# Altium footprint library ICs And Semiconductors THD.PcbLib: 292 footprints (part 2 of 19)
Each footprint in its own frame and in the unit in brackets; x right, y up, seen from the top. Pads: shape width x height; smd on the part's side, far side on the other; paste and mask are expansions set on the pad; w line width, h text height; cw(c..) or ccw(c..) is an arc to the next point about the centre after c.
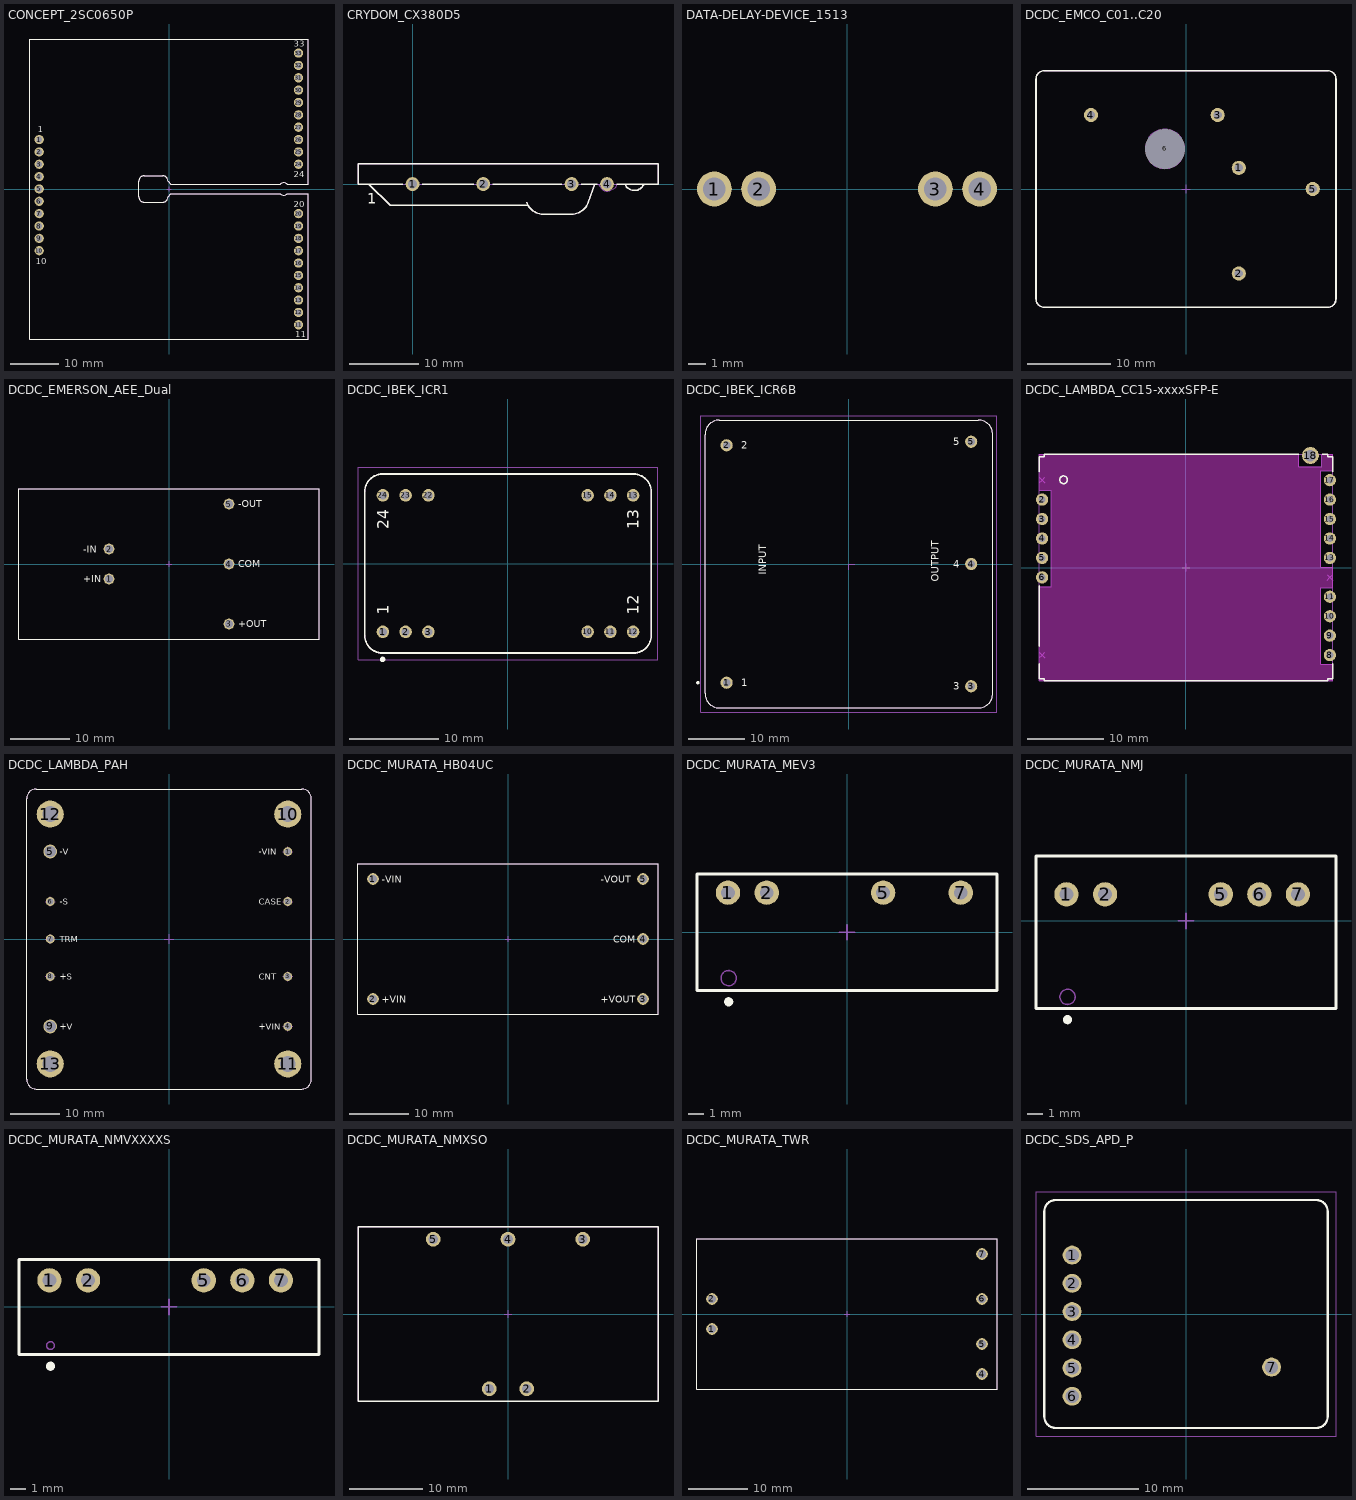
[diagram p1: the footprints below, top view; thin cyan lines are the x and y axes]

## CONCEPT_2SC0650P [mm] "Dual-Channel High-Power High-Frequency SCALE-2 Driver Core"
height 6.5
pads (30):
  round 1.9 hole 1.2: 1(-26.7,10.17) 2(-26.7,7.63) 3(-26.7,5.09) 4(-26.7,2.55) 5(-26.7,0.01) 6(-26.7,-2.53) 7(-26.7,-5.07) 8(-26.7,-7.61) 9(-26.7,-10.15) 10(-26.7,-12.69) 11(26.64,-27.93) 12(26.64,-25.39) 13(26.64,-22.85) 14(26.64,-20.31) 15(26.64,-17.77) 16(26.64,-15.23) 17(26.64,-12.69) 18(26.64,-10.15) 19(26.64,-7.61) 20(26.64,-5.07) 24(26.64,5.09) 25(26.64,7.63) 26(26.64,10.17) 27(26.64,12.71) 28(26.64,15.25) 29(26.64,17.79) 30(26.64,20.33) 31(26.64,22.87) 32(26.64,25.41) 33(26.64,27.95)
Top Overlay:
  lines w0.2: -28.6,-30.85 28.6,-30.85 28.6,-1 24.35,-1 cw(c23.6,0) 22.85,-1 0.4,-1 -0.2,-1.6 cw(c-1.3,-1.6) -1.3,-2.7 -5.1,-2.7 cw(c-5.1,-1.6) -6.2,-1.6 -6.2,1.6 cw(c-5.1,1.6) -5.1,2.7 -1.3,2.7 cw(c-1.3,1.6) -0.2,1.6 0.4,1 22.85,1 cw(c23.6,0) 24.35,1 28.6,1 28.6,30.85 -28.6,30.85 -28.6,-30.85
  text "1" at -26.973,11.627 h1.27
  text "10" at -27.453,-15.483 h1.27
  text "33" at 25.696,29.253 h1.27
  text "20" at 25.696,-3.767 h1.27
  text "24" at 25.684,2.387 h1.27
  text "11" at 25.94,-30.497 h1.27
Notvisible:
  lines w0.1: -27.2,-12.69 -26.7,-12.69 ; -27.2,-10.15 -26.7,-10.15 ; -27.2,-7.61 -26.7,-7.61 ; -27.2,-5.07 -26.7,-5.07 ; -27.2,-2.53 -26.7,-2.53 ; -27.2,0.01 -26.7,0.01 ; -27.2,2.55 -26.7,2.55 ; -27.2,5.09 -26.7,5.09 ; -27.2,7.63 -26.7,7.63 ; -27.2,10.17 -26.7,10.17 ; -26.7,-13.19 -26.7,-12.69 ; -26.7,-12.19 -26.7,-12.69 ; -26.7,-10.65 -26.7,-10.15 ; -26.7,-9.65 -26.7,-10.15 ; -26.7,-8.11 -26.7,-7.61 ; -26.7,-7.11 -26.7,-7.61 ; -26.7,-5.57 -26.7,-5.07 ; -26.7,-4.57 -26.7,-5.07 ; -26.7,-3.03 -26.7,-2.53 ; -26.7,-2.03 -26.7,-2.53 ; -26.7,-0.49 -26.7,0.01 ; -26.7,0.51 -26.7,0.01 ; -26.7,2.05 -26.7,2.55 ; -26.7,3.05 -26.7,2.55 ; -26.7,4.59 -26.7,5.09 ; -26.7,5.59 -26.7,5.09 ; -26.7,7.13 -26.7,7.63 ; -26.7,8.13 -26.7,7.63 ; -26.7,9.67 -26.7,10.17 ; -26.7,10.67 -26.7,10.17 ; -26.2,-12.69 -26.7,-12.69 ; -26.2,-10.15 -26.7,-10.15 ; -26.2,-7.61 -26.7,-7.61 ; -26.2,-5.07 -26.7,-5.07 ; -26.2,-2.53 -26.7,-2.53 ; -26.2,0.01 -26.7,0.01 ; -26.2,2.55 -26.7,2.55 ; -26.2,5.09 -26.7,5.09 ; -26.2,7.63 -26.7,7.63 ; -26.2,10.17 -26.7,10.17 ; -0.5,0 0,0 ; 0,-0.5 0,0 ; 0,0.5 0,0 ; 0.5,0 0,0 ; 26.14,-27.93 26.64,-27.93 ; 26.14,-25.39 26.64,-25.39 ; 26.14,-22.85 26.64,-22.85 ; 26.14,-20.31 26.64,-20.31 ; 26.14,-17.77 26.64,-17.77 ; 26.14,-15.23 26.64,-15.23 ; 26.14,-12.69 26.64,-12.69 ; 26.14,-10.15 26.64,-10.15 ; 26.14,-7.61 26.64,-7.61 ; 26.14,-5.07 26.64,-5.07 ; 26.14,5.09 26.64,5.09 ; 26.14,7.63 26.64,7.63 ; 26.14,10.17 26.64,10.17 ; 26.14,12.71 26.64,12.71 ; 26.14,15.25 26.64,15.25 ; 26.14,17.79 26.64,17.79 ; 26.14,20.33 26.64,20.33 ; 26.14,22.87 26.64,22.87 ; 26.14,25.41 26.64,25.41 ; 26.14,27.95 26.64,27.95 ; 26.64,-28.43 26.64,-27.93 ; 26.64,-27.43 26.64,-27.93 ; 26.64,-25.89 26.64,-25.39 ; 26.64,-24.89 26.64,-25.39 ; 26.64,-23.35 26.64,-22.85 ; 26.64,-22.35 26.64,-22.85 ; 26.64,-20.81 26.64,-20.31 ; 26.64,-19.81 26.64,-20.31 ; 26.64,-18.27 26.64,-17.77 ; 26.64,-17.27 26.64,-17.77 ; 26.64,-15.73 26.64,-15.23 ; 26.64,-14.73 26.64,-15.23 ; 26.64,-13.19 26.64,-12.69 ; 26.64,-12.19 26.64,-12.69 ; 26.64,-10.65 26.64,-10.15 ; 26.64,-9.65 26.64,-10.15 ; 26.64,-8.11 26.64,-7.61 ; 26.64,-7.11 26.64,-7.61 ; 26.64,-5.57 26.64,-5.07 ; 26.64,-4.57 26.64,-5.07 ; 26.64,4.59 26.64,5.09 ; 26.64,5.59 26.64,5.09 ; 26.64,7.13 26.64,7.63 ; 26.64,8.13 26.64,7.63 ; 26.64,9.67 26.64,10.17 ; 26.64,10.67 26.64,10.17 ; 26.64,12.21 26.64,12.71 ; 26.64,13.21 26.64,12.71 ; 26.64,14.75 26.64,15.25 ; 26.64,15.75 26.64,15.25 ; 26.64,17.29 26.64,17.79 ; 26.64,18.29 26.64,17.79 ; 26.64,19.83 26.64,20.33 ; 26.64,20.83 26.64,20.33 ; 26.64,22.37 26.64,22.87 ; 26.64,23.37 26.64,22.87 ; 26.64,24.91 26.64,25.41 ; 26.64,25.91 26.64,25.41 ; 26.64,27.45 26.64,27.95 ; 26.64,28.45 26.64,27.95 ; 27.14,-27.93 26.64,-27.93 ; 27.14,-25.39 26.64,-25.39 ; 27.14,-22.85 26.64,-22.85 ; 27.14,-20.31 26.64,-20.31 ; 27.14,-17.77 26.64,-17.77 ; 27.14,-15.23 26.64,-15.23 ; 27.14,-12.69 26.64,-12.69 ; 27.14,-10.15 26.64,-10.15 ; 27.14,-7.61 26.64,-7.61 ; 27.14,-5.07 26.64,-5.07 ; 27.14,5.09 26.64,5.09 ; 27.14,7.63 26.64,7.63 ; 27.14,10.17 26.64,10.17 ; 27.14,12.71 26.64,12.71 ; 27.14,15.25 26.64,15.25 ; 27.14,17.79 26.64,17.79 ; 27.14,20.33 26.64,20.33 ; 27.14,22.87 26.64,22.87 ; 27.14,25.41 26.64,25.41 ; 27.14,27.95 26.64,27.95
Mechanical 14:
  lines w0.1: -28.6,-30.85 28.6,-30.85 28.6,-1 24.35,-1 cw(c23.6,0) 22.85,-1 0.4,-1 -0.2,-1.6 cw(c-1.3,-1.6) -1.3,-2.7 -5.1,-2.7 cw(c-5.1,-1.6) -6.2,-1.6 -6.2,1.6 cw(c-5.1,1.6) -5.1,2.7 -1.3,2.7 cw(c-1.3,1.6) -0.2,1.6 0.4,1 22.85,1 cw(c23.6,0) 24.35,1 28.6,1 28.6,30.85 -28.6,30.85 -28.6,-30.85
  text "1" at -26.973,11.627 h1.27
  text "10" at -27.453,-15.483 h1.27
  text "33" at 25.696,29.253 h1.27
  text "20" at 25.696,-3.767 h1.27
  text "24" at 25.684,2.387 h1.27
  text "11" at 25.94,-30.497 h1.27
3D body "CONCEPT_2SC0650P.stp": height 6.68, standoff -2.54, extent -28.6,-30.85 28.6,30.85

## CRYDOM_CX380D5 [mm] "CRYDOM CX Serie, 4 Leads, Body 43.1 x 7.6mm, SIP Solid State Relay"
height 26.7
pads (4):
  round 2 hole 1.3: 1(0,0) 2(10.16,0) 3(22.86,0) 4(27.94,0)
Top Overlay:
  lines w0.2: -6.263,0 -3.215,-3.048 16.581,-3.048 ; -1.4,0 -7.834,0 -7.834,2.911 35.266,2.911 35.266,0 29.34,0 ; 1.4,0 8.76,0 ; 11.56,0 21.46,0 ; 16.379,-2.605 ccw(c18.781,-1.778) 18.781,-4.318 22.852,-4.318 ccw(c22.852,-1.778) 25.253,-2.605 26.15,0 ; 24.26,0 26.54,0 ; 30.534,0 ccw(c31.89,0.544) 33.11,-0.258 33.28,0
  text "1" at -6.5,-2.8 h1.5
Notvisible:
  lines w0.1: -0.5,0 0,0 ; 0,-0.5 0,0 ; 0,0.5 0,0 ; 0.5,0 0,0 ; 9.66,0 10.16,0 ; 10.16,-0.5 10.16,0 ; 10.16,0.5 10.16,0 ; 10.66,0 10.16,0 ; 22.36,0 22.86,0 ; 22.86,-0.5 22.86,0 ; 22.86,0.5 22.86,0 ; 23.36,0 22.86,0 ; 27.44,0 27.94,0 ; 27.94,-0.5 27.94,0 ; 27.94,0.5 27.94,0 ; 28.44,0 27.94,0
Mechanical 14:
  lines w0.1: -6.263,0 -3.215,-3.048 16.581,-3.048 ; 16.379,-2.605 ccw(c18.781,-1.778) 18.781,-4.318 22.852,-4.318 ccw(c22.852,-1.778) 25.253,-2.605 26.15,0 ; 26.695,0 26.936,-0.365 ccw(c28.08,0.544) 29.435,0 ; 27.053,-0.495 ccw(c27.94,0) 28.48,-0.861 ; 30.534,0 ccw(c31.89,0.544) 33.11,-0.258 33.28,0 ; -7.834,0 -7.834,2.911 35.266,2.911 35.266,0 -7.834,0
  text "1" at -6.5,-2.8 h1.5
3D body "CRYDOM_CX380D5.stp": height 26.7, standoff -5.08, extent -7.834,-4.318 35.266,2.911

## DATA-DELAY-DEVICE_1513 [mm] "DATA-DELAY-DEVICE 1513 Serie, 4 Leads, Body 20.57 x 5.33mm, SIP Delay Line"
height 7.11
pads (4):
  round 2 hole 1.3: 1(-7.62,0) 2(-5.08,0) 3(5.08,0) 4(7.62,0)

## DCDC_EMCO_C01..C20 [mm] "C Series , Body 35.56 x 27.94mm, High Voltage DC-DC Converter"
height 13.21
pads (6):
  round 1.7 hole 1: 1(6.35,2.54) 2(6.35,-10.16) 3(3.81,8.89) 4(-11.43,8.89) 5(15.24,0)
  round 1 hole 4.8 unplated mask+1.9: 6(-2.54,4.83)
Top Overlay:
  lines w0.2: -18.035,-13.225 ccw(c-17.035,-13.225) -17.035,-14.225 17.035,-14.225 ccw(c17.035,-13.225) 18.035,-13.225 18.035,13.225 ccw(c17.035,13.225) 17.035,14.225 -17.035,14.225 ccw(c-17.035,13.225) -18.035,13.225 -18.035,-13.225
Notvisible:
  circle w0.1: c-2.54,4.83 r2.375
  lines w0.1: -11.93,8.89 -11.43,8.89 ; -11.43,8.39 -11.43,8.89 ; -11.43,9.39 -11.43,8.89 ; -10.93,8.89 -11.43,8.89 ; -3.04,4.83 -2.54,4.83 ; -2.54,4.33 -2.54,4.83 ; -2.54,5.33 -2.54,4.83 ; -2.04,4.83 -2.54,4.83 ; -0.5,0 0,0 ; 0,-0.5 0,0 ; 0,0.5 0,0 ; 0.5,0 0,0 ; 3.31,8.89 3.81,8.89 ; 3.81,8.39 3.81,8.89 ; 3.81,9.39 3.81,8.89 ; 4.31,8.89 3.81,8.89 ; 5.85,-10.16 6.35,-10.16 ; 5.85,2.54 6.35,2.54 ; 6.35,-10.66 6.35,-10.16 ; 6.35,-9.66 6.35,-10.16 ; 6.35,2.04 6.35,2.54 ; 6.35,3.04 6.35,2.54 ; 6.85,-10.16 6.35,-10.16 ; 6.85,2.54 6.35,2.54 ; 14.74,0 15.24,0 ; 15.24,-0.5 15.24,0 ; 15.24,0.5 15.24,0 ; 15.74,0 15.24,0
Mechanical 14:
  lines w0.1: -18.035,-13.225 ccw(c-17.035,-13.225) -17.035,-14.225 17.035,-14.225 ccw(c17.035,-13.225) 18.035,-13.225 18.035,13.225 ccw(c17.035,13.225) 17.035,14.225 -17.035,14.225 ccw(c-17.035,13.225) -18.035,13.225 -18.035,-13.225
3D body "DCDC_EMCO_C.stp": height 13.21, standoff -3.8, extent -18.035,-14.225 18.035,14.225

## DCDC_EMERSON_AEE_Dual [mm] "AEE 15W Series , Dual Output DCDC Converter, Body 50.8x25.4mm, Height 11.3mm"
height 11.3
pads (5):
  round 1.8 hole 1.3: 1(-10.16,-2.54) 2(-10.16,2.54) 3(10.16,-10.16) 4(10.16,0) 5(10.16,10.16)
Top Overlay:
  lines w0.2: -25.4,-12.7 -25.4,12.7 25.4,12.7 25.4,-12.7 -25.4,-12.7
  text "-IN" at -14.55,1.9 h1.2
  text "-OUT" at 11.71,9.645 h1.2
  text "+OUT" at 11.71,-10.675 h1.2
  text "+IN" at -14.55,-3.1 h1.2
  text "COM" at 11.71,-0.515 h1.2
Notvisible:
  lines w0.1: -10.66,-2.54 -10.16,-2.54 ; -10.66,2.54 -10.16,2.54 ; -10.16,-3.04 -10.16,-2.54 ; -10.16,-2.04 -10.16,-2.54 ; -10.16,2.04 -10.16,2.54 ; -10.16,3.04 -10.16,2.54 ; -9.66,-2.54 -10.16,-2.54 ; -9.66,2.54 -10.16,2.54 ; -0.5,0 0,0 ; 0,-0.5 0,0 ; 0,0.5 0,0 ; 0.5,0 0,0 ; 9.66,-10.16 10.16,-10.16 ; 9.66,0 10.16,0 ; 9.66,10.16 10.16,10.16 ; 10.16,-10.66 10.16,-10.16 ; 10.16,-9.66 10.16,-10.16 ; 10.16,-0.5 10.16,0 ; 10.16,0.5 10.16,0 ; 10.16,9.66 10.16,10.16 ; 10.16,10.66 10.16,10.16 ; 10.66,-10.16 10.16,-10.16 ; 10.66,0 10.16,0 ; 10.66,10.16 10.16,10.16
Mechanical 14:
  lines w0.1: -25.4,-12.7 -25.4,12.7 25.4,12.7 25.4,-12.7 -25.4,-12.7
  text "+OUT" at 11.71,-10.675 h1.2
  text "-OUT" at 11.71,9.645 h1.2
  text "+IN" at -14.55,-3.1 h1.2
  text "-IN" at -14.55,1.9 h1.2
  text "COM" at 11.71,-0.515 h1.2
3D body "DCDC_EMERSON_AEE_Dual.stp": height 11.3, standoff -3.8, extent -25.4,-12.7 25.4,12.7

## DCDC_IBEK_ICR1 [mm] "ICR1 Series , Body 32x20mm, Pitch 2.54mm"
height 10.5
pads (12):
  round 1.4 hole 0.9: 1(-13.97,-7.62) 2(-11.43,-7.62) 3(-8.89,-7.62) 10(8.89,-7.62) 11(11.43,-7.62) 12(13.97,-7.62) 13(13.97,7.62) 14(11.43,7.62) 15(8.89,7.62) 22(-8.89,7.62) 23(-11.43,7.62) 24(-13.97,7.62)
Top Overlay:
  circle w0.3: c-14,-10.7 r0.15
  lines w0.2: -16,-8 ccw(c-14,-8) -14,-10 14,-10 ccw(c14,-8) 16,-8 16,8 ccw(c14,8) 14,10 -14,10 ccw(c-14,8) -16,8 -16,-8
  text "12" at 14.605,-5.715 h1.27
  text "24" at -13.335,3.81 h1.27
  text "13" at 14.605,3.81 h1.27
  text "1" at -13.335,-5.715 h1.27
Mechanical 14:
  lines w0.1: -16,-8 ccw(c-14,-8) -14,-10 14,-10 ccw(c14,-8) 16,-8 16,8 ccw(c14,8) 14,10 -14,10 ccw(c-14,8) -16,8 -16,-8
  text "24" at -13.335,3.81 h1.27
  text "13" at 14.605,3.81 h1.27
  text "12" at 14.605,-5.715 h1.27
  text "1" at -13.335,-5.715 h1.27
Mechanical 15:
  lines w0.05: -16.75,-10.75 -16.75,10.75 16.75,10.75 16.75,-10.75 -16.75,-10.75
3D body "DCDC_IBEK_ICR1.stp": height 10.5, standoff -3, extent -16,-10 16,10

## DCDC_IBEK_ICR6B [mm] "ICR6 Series , Body 50.8x50.8mm"
height 10.5
pads (5):
  round 2.15 hole 1.3: 1(-21.59,-20.955) 2(-21.59,20.955) 3(21.59,-21.59) 4(21.59,0) 5(21.59,21.59)
Top Overlay:
  circle w0.3: c-26.67,-20.955 r0.15
  lines w0.2: -25.4,-22.86 ccw(c-22.86,-22.86) -22.86,-25.4 22.86,-25.4 ccw(c22.86,-22.86) 25.4,-22.86 25.4,22.86 ccw(c22.86,22.86) 22.86,25.4 -22.86,25.4 ccw(c-22.86,22.86) -25.4,22.86 -25.4,-22.86
  text "3" at 18.415,-22.225 h1.27
  text "4" at 18.415,-0.635 h1.27
  text "5" at 18.415,20.955 h1.27
  text "2" at -19.05,20.32 h1.27
  text "1" at -19.05,-21.59 h1.27
  text "INPUT" at -14.605,-1.905 h1.27
  text "OUTPUT" at 15.875,-3.175 h1.27
Notvisible:
  circle w0.1: c-21.59,-20.955 r0.5
  circle w0.1: c21.59,-21.59 r0.5
  circle w0.1: c21.59,0 r0.5
  circle w0.1: c21.59,21.59 r0.5
  circle w0.1: c-21.59,20.955 r0.5
  lines w0.2: -21.59,-21.955 -21.59,-20.955 -20.59,-20.955 ; -21.59,19.955 -21.59,20.955 -20.59,20.955 ; 0,-1 0,0 1,0 ; 21.59,-22.59 21.59,-21.59 22.59,-21.59 ; 21.59,-1 21.59,0 22.59,0 ; 21.59,20.59 21.59,21.59 22.59,21.59
Mechanical 14:
  lines w0.1: -25.4,-22.86 ccw(c-22.86,-22.86) -22.86,-25.4 22.86,-25.4 ccw(c22.86,-22.86) 25.4,-22.86 25.4,22.86 ccw(c22.86,22.86) 22.86,25.4 -22.86,25.4 ccw(c-22.86,22.86) -25.4,22.86 -25.4,-22.86
  text "3" at 18.415,-22.225 h1.27
  text "4" at 18.415,-0.635 h1.27
  text "5" at 18.415,20.955 h1.27
  text "2" at -19.05,20.32 h1.27
  text "1" at -19.05,-21.59 h1.27
  text "INPUT" at -14.605,-1.905 h1.27
  text "OUTPUT" at 15.875,-3.175 h1.27
Mechanical 15:
  lines w0.05: -26.15,-26.15 -26.15,26.15 26.15,26.15 26.15,-26.15 -26.15,-26.15
3D body "DCDC_IBEK_ICR6B.stp": height 10.5, standoff -3, extent -25.4,-25.4 25.4,25.4

## DCDC_LAMBDA_CC15-xxxxSFP-E [mm] "CCP-E Series, Body L 38.4mm x W 29.6mm x H 6.8mm"
height 6.8
pads (15):
  round 1.6 hole 0.9: 2(-18.8,8.89) 3(-18.8,6.35) 4(-18.8,3.81) 5(-18.8,1.27) 6(-18.8,-1.27) 8(18.8,-11.43) 9(18.8,-8.89) 10(18.8,-6.35) 11(18.8,-3.81) 13(18.8,1.27) 14(18.8,3.81) 15(18.8,6.35) 16(18.8,8.89) 17(18.8,11.43)
  round 2.2 hole 1.5: 18(16.26,14.65)
Top Layer keep-out:
  region: -19.2,-2.47 -17.6,-2.47 -17.6,10.09 -19.2,10.09 -19.2,14.8 14.76,14.8 14.76,13.15 17.76,13.15 17.76,14.8 19.2,14.8 19.2,12.63 17.6,12.63 17.6,0.07 19.2,0.07 19.2,-2.61 17.6,-2.61 17.6,-12.63 19.2,-12.63 19.2,-14.8 -19.2,-14.8
Top Overlay:
  circle w0.2: c-16,11.48 r0.5
  lines w0.2: -19.2,-12.561 -19.2,-14.5 -18.5,-14.5 -18.5,-14.8 18.5,-14.8 18.5,-14.5 19.2,-14.5 19.2,-12.561 ; -19.2,-10.299 -19.2,-2.401 ; -19.2,12.561 -19.2,14.5 -18.5,14.5 -18.5,14.8 14.732,14.8 ; 17.78,14.8 18.5,14.8 18.5,14.5 19.2,14.5 19.2,12.561
Notvisible:
  lines w0.1: -19.3,-1.27 -18.8,-1.27 ; -19.3,1.27 -18.8,1.27 ; -19.3,3.81 -18.8,3.81 ; -19.3,6.35 -18.8,6.35 ; -19.3,8.89 -18.8,8.89 ; -19.154,-11.784 -18.8,-11.43 ; -19.154,-11.076 -18.8,-11.43 ; -19.154,11.076 -18.8,11.43 ; -19.154,11.784 -18.8,11.43 ; -18.8,-1.77 -18.8,-1.27 ; -18.8,-0.77 -18.8,-1.27 ; -18.8,0.77 -18.8,1.27 ; -18.8,1.77 -18.8,1.27 ; -18.8,3.31 -18.8,3.81 ; -18.8,4.31 -18.8,3.81 ; -18.8,5.85 -18.8,6.35 ; -18.8,6.85 -18.8,6.35 ; -18.8,8.39 -18.8,8.89 ; -18.8,9.39 -18.8,8.89 ; -18.446,-11.784 -18.8,-11.43 ; -18.446,-11.076 -18.8,-11.43 ; -18.446,11.076 -18.8,11.43 ; -18.446,11.784 -18.8,11.43 ; -18.3,-1.27 -18.8,-1.27 ; -18.3,1.27 -18.8,1.27 ; -18.3,3.81 -18.8,3.81 ; -18.3,6.35 -18.8,6.35 ; -18.3,8.89 -18.8,8.89 ; -0.5,0 0,0 ; 0,-0.5 0,0 ; 0,0.5 0,0 ; 0.5,0 0,0 ; 15.76,14.65 16.26,14.65 ; 16.26,14.15 16.26,14.65 ; 16.26,15.15 16.26,14.65 ; 16.76,14.65 16.26,14.65 ; 18.3,-11.43 18.8,-11.43 ; 18.3,-8.89 18.8,-8.89 ; 18.3,-6.35 18.8,-6.35 ; 18.3,-3.81 18.8,-3.81 ; 18.3,1.27 18.8,1.27 ; 18.3,3.81 18.8,3.81 ; 18.3,6.35 18.8,6.35 ; 18.3,8.89 18.8,8.89 ; 18.3,11.43 18.8,11.43 ; 18.446,-1.624 18.8,-1.27 ; 18.446,-0.916 18.8,-1.27 ; 18.8,-11.93 18.8,-11.43 ; 18.8,-10.93 18.8,-11.43 ; 18.8,-9.39 18.8,-8.89 ; 18.8,-8.39 18.8,-8.89 ; 18.8,-6.85 18.8,-6.35 ; 18.8,-5.85 18.8,-6.35 ; 18.8,-4.31 18.8,-3.81 ; 18.8,-3.31 18.8,-3.81 ; 18.8,0.77 18.8,1.27 ; 18.8,1.77 18.8,1.27 ; 18.8,3.31 18.8,3.81 ; 18.8,4.31 18.8,3.81 ; 18.8,5.85 18.8,6.35 ; 18.8,6.85 18.8,6.35 ; 18.8,8.39 18.8,8.89 ; 18.8,9.39 18.8,8.89 ; 18.8,10.93 18.8,11.43 ; 18.8,11.93 18.8,11.43 ; 19.154,-1.624 18.8,-1.27 ; 19.154,-0.916 18.8,-1.27 ; 19.3,-11.43 18.8,-11.43 ; 19.3,-8.89 18.8,-8.89 ; 19.3,-6.35 18.8,-6.35 ; 19.3,-3.81 18.8,-3.81 ; 19.3,1.27 18.8,1.27 ; 19.3,3.81 18.8,3.81 ; 19.3,6.35 18.8,6.35 ; 19.3,8.89 18.8,8.89 ; 19.3,11.43 18.8,11.43 ; -19.2,-14.8 19.2,-14.8 19.2,-12.63 17.6,-12.63 17.6,-2.61 19.2,-2.61 19.2,0.07 17.6,0.07 17.6,12.63 19.2,12.63 19.2,14.8 17.76,14.8 17.76,13.15 14.76,13.15 14.76,14.8 -19.2,14.8 -19.2,10.09 -17.6,10.09 -17.6,-2.47 -19.2,-2.47 -19.2,-14.8
Mechanical 14:
  circle w0.1: c-16,11.48 r0.5
  lines w0.1: -19.2,-14.5 -19.2,14.5 -18.5,14.5 -18.5,14.8 18.5,14.8 18.5,14.5 19.2,14.5 19.2,-14.5 18.5,-14.5 18.5,-14.8 -18.5,-14.8 -18.5,-14.5 -19.2,-14.5
3D body "DC-DC_LAMBDA_CC15-xxxxSFP-E.stp": height 6.3, standoff -2.5, extent -19.2,-14.8 19.2,14.8

## DCDC_LAMBDA_PAH [mm] "PAH Series , Body 57.9x61mm"
height 12.95
pads (13):
  round 1.8 hole 1.3: 1(24.15,17.78) 2(24.15,7.62) 3(24.15,-7.62) 4(24.15,-17.78) 6(-24.15,7.62) 7(-24.15,0) 8(-24.15,-7.62)
  round 2.8 hole 2.3: 5(-24.15,17.78) 9(-24.15,-17.78)
  round 5.5 hole 3.2: 10(24.15,25.4) 11(24.15,-25.4) 12(-24.15,25.4) 13(-24.15,-25.4)
Top Overlay:
  lines w0.2: -28.95,-28.5 ccw(c-26.95,-28.5) -26.95,-30.5 26.95,-30.5 ccw(c26.95,-28.5) 28.95,-28.5 28.95,28.5 ccw(c26.95,28.5) 26.95,30.5 -26.95,30.5 ccw(c-26.95,28.5) -28.95,28.5 -28.95,-28.5
  text "+VIN" at 18.265,-18.435 h1.27
  text "CNT" at 18.265,-8.275 h1.27
  text "CASE" at 18.265,6.965 h1.27
  text "-V" at -22.175,17.085 h1.27
  text "+V" at -22.175,-18.475 h1.27
  text "+S" at -22.175,-8.315 h1.27
  text "-S" at -22.175,6.925 h1.27
  text "-VIN" at 18.265,17.125 h1.27
  text "TRM" at -22.175,-0.695 h1.27
Notvisible:
  lines w0.1: -25.15,-25.4 -24.15,-25.4 ; -25.15,-17.78 -24.15,-17.78 ; -25.15,-7.62 -24.15,-7.62 ; -25.15,0 -24.15,0 ; -25.15,7.62 -24.15,7.62 ; -25.15,17.78 -24.15,17.78 ; -25.15,25.4 -24.15,25.4 ; -24.15,-26.4 -24.15,-25.4 ; -24.15,-24.4 -24.15,-25.4 ; -24.15,-18.78 -24.15,-17.78 ; -24.15,-16.78 -24.15,-17.78 ; -24.15,-8.62 -24.15,-7.62 ; -24.15,-6.62 -24.15,-7.62 ; -24.15,-1 -24.15,0 ; -24.15,1 -24.15,0 ; -24.15,6.62 -24.15,7.62 ; -24.15,8.62 -24.15,7.62 ; -24.15,16.78 -24.15,17.78 ; -24.15,18.78 -24.15,17.78 ; -24.15,24.4 -24.15,25.4 ; -24.15,26.4 -24.15,25.4 ; -23.15,-25.4 -24.15,-25.4 ; -23.15,-17.78 -24.15,-17.78 ; -23.15,-7.62 -24.15,-7.62 ; -23.15,0 -24.15,0 ; -23.15,7.62 -24.15,7.62 ; -23.15,17.78 -24.15,17.78 ; -23.15,25.4 -24.15,25.4 ; -1,0 0,0 ; 0,-1 0,0 ; 0,1 0,0 ; 1,0 0,0 ; 23.15,-25.4 24.15,-25.4 ; 23.15,-17.78 24.15,-17.78 ; 23.15,-7.62 24.15,-7.62 ; 23.15,7.62 24.15,7.62 ; 23.15,17.78 24.15,17.78 ; 23.15,25.4 24.15,25.4 ; 24.15,-26.4 24.15,-25.4 ; 24.15,-24.4 24.15,-25.4 ; 24.15,-18.78 24.15,-17.78 ; 24.15,-16.78 24.15,-17.78 ; 24.15,-8.62 24.15,-7.62 ; 24.15,-6.62 24.15,-7.62 ; 24.15,6.62 24.15,7.62 ; 24.15,8.62 24.15,7.62 ; 24.15,16.78 24.15,17.78 ; 24.15,18.78 24.15,17.78 ; 24.15,24.4 24.15,25.4 ; 24.15,26.4 24.15,25.4 ; 25.15,-25.4 24.15,-25.4 ; 25.15,-17.78 24.15,-17.78 ; 25.15,-7.62 24.15,-7.62 ; 25.15,7.62 24.15,7.62 ; 25.15,17.78 24.15,17.78 ; 25.15,25.4 24.15,25.4
Mechanical 14:
  lines w0.1: -28.95,-28.5 ccw(c-26.95,-28.5) -26.95,-30.5 26.95,-30.5 ccw(c26.95,-28.5) 28.95,-28.5 28.95,28.5 ccw(c26.95,28.5) 26.95,30.5 -26.95,30.5 ccw(c-26.95,28.5) -28.95,28.5 -28.95,-28.5
  text "+VIN" at 18.265,-18.435 h1.27
  text "CNT" at 18.265,-8.275 h1.27
  text "CASE" at 18.265,6.965 h1.27
  text "-V" at -22.175,17.085 h1.27
  text "+V" at -22.175,-18.475 h1.27
  text "+S" at -22.175,-8.315 h1.27
  text "-S" at -22.175,6.925 h1.27
  text "-VIN" at 18.265,17.125 h1.27
  text "TRM" at -22.175,-0.695 h1.27
3D body "DC-DC_LAMBDA_PAH.stp": height 12.95, standoff -3.8, extent -28.95,-30.5 28.95,30.5

## DCDC_MURATA_HB04UC [mm] "HB04UC Series , Body 50.8x25.4mm, Height 10.4mm"
height 10.41
pads (5):
  round 2 hole 1.3: 1(-22.86,10.16) 2(-22.86,-10.16) 3(22.86,-10.16) 4(22.86,0) 5(22.86,10.16)
Top Overlay:
  lines w0.2: -25.4,-12.7 25.4,-12.7 25.4,12.7 -25.4,12.7 -25.4,-12.7
  text "+VIN" at -21.385,-10.765 h1.2
  text "+VOUT" at 15.725,-10.815 h1.2
  text "-VIN" at -21.385,9.555 h1.2
  text "COM" at 17.825,-0.605 h1.2
  text "-VOUT" at 15.725,9.505 h1.2
Notvisible:
  lines w0.1: -23.36,-10.16 -22.86,-10.16 ; -23.36,10.16 -22.86,10.16 ; -22.86,-10.66 -22.86,-10.16 ; -22.86,-9.66 -22.86,-10.16 ; -22.86,9.66 -22.86,10.16 ; -22.86,10.66 -22.86,10.16 ; -22.36,-10.16 -22.86,-10.16 ; -22.36,10.16 -22.86,10.16 ; -0.5,0 0,0 ; 0,-0.5 0,0 ; 0,0.5 0,0 ; 0.5,0 0,0 ; 22.36,-10.16 22.86,-10.16 ; 22.36,0 22.86,0 ; 22.36,10.16 22.86,10.16 ; 22.86,-10.66 22.86,-10.16 ; 22.86,-9.66 22.86,-10.16 ; 22.86,-0.5 22.86,0 ; 22.86,0.5 22.86,0 ; 22.86,9.66 22.86,10.16 ; 22.86,10.66 22.86,10.16 ; 23.36,-10.16 22.86,-10.16 ; 23.36,0 22.86,0 ; 23.36,10.16 22.86,10.16
Mechanical 14:
  lines w0.1: -25.4,-12.7 25.4,-12.7 25.4,12.7 -25.4,12.7 -25.4,-12.7
  text "+VIN" at -21.385,-10.765 h1.2
  text "+VOUT" at 15.725,-10.815 h1.2
  text "-VIN" at -21.385,9.555 h1.2
  text "COM" at 17.825,-0.605 h1.2
  text "-VOUT" at 15.725,9.505 h1.2
3D body "DCDC_MURATA_HB04UC.stp": height 10.46, standoff -3.8, extent -25.4,-12.7 25.4,12.7

## DCDC_MURATA_MEV3 [mm] "MEV3S Series , Body 19.65 x 7.65mm, SIP-7"
height 10.15
pads (4):
  round 1.6 hole 0.9: 1(-7.795,2.6) 2(-5.255,2.6) 5(2.365,2.6) 7(7.445,2.6)
Top Overlay:
  circle w0.3: c-7.75,-4.55 r0.15
  lines w0.2: -9.825,-3.825 9.825,-3.825 9.825,3.825 -9.825,3.825 -9.825,-3.825
Notvisible:
  lines w0.1: -8.295,2.6 -7.795,2.6 ; -7.795,2.1 -7.795,2.6 ; -7.795,3.1 -7.795,2.6 ; -7.295,2.6 -7.795,2.6 ; -5.755,2.6 -5.255,2.6 ; -5.255,2.1 -5.255,2.6 ; -5.255,3.1 -5.255,2.6 ; -4.755,2.6 -5.255,2.6 ; -0.5,0 0,0 ; 0,-0.5 0,0 ; 0,0.5 0,0 ; 0.5,0 0,0 ; 1.865,2.6 2.365,2.6 ; 2.365,2.1 2.365,2.6 ; 2.365,3.1 2.365,2.6 ; 2.865,2.6 2.365,2.6 ; 6.945,2.6 7.445,2.6 ; 7.445,2.1 7.445,2.6 ; 7.445,3.1 7.445,2.6 ; 7.945,2.6 7.445,2.6
Mechanical 14:
  circle w0.1: c-7.75,-3 r0.5
  lines w0.1: -9.825,-3.825 9.825,-3.825 9.825,3.825 -9.825,3.825 -9.825,-3.825
3D body "DCDC_MURATA_MEV3.stp": height 10.15, standoff -3.6, extent -9.825,-3.825 9.825,3.825

## DCDC_MURATA_NMJ [mm] "NMJ Series , Body 19.5 x 9.8mm, SIP-7"
height 12.5
pads (5):
  round 1.6 hole 0.9: 1(-7.87,1.75) 2(-5.33,1.75) 5(2.29,1.75) 6(4.83,1.75) 7(7.37,1.75)
Top Overlay:
  circle w0.3: c-7.8,-6.5 r0.15
  lines w0.2: -9.875,-5.775 9.875,-5.775 9.875,4.275 -9.875,4.275 -9.875,-5.775
Notvisible:
  lines w0.1: -8.37,1.75 -7.87,1.75 ; -7.87,1.25 -7.87,1.75 ; -7.87,2.25 -7.87,1.75 ; -7.37,1.75 -7.87,1.75 ; -5.83,1.75 -5.33,1.75 ; -5.33,1.25 -5.33,1.75 ; -5.33,2.25 -5.33,1.75 ; -4.83,1.75 -5.33,1.75 ; -0.5,0 0,0 ; 0,-0.5 0,0 ; 0,0.5 0,0 ; 0.5,0 0,0 ; 1.79,1.75 2.29,1.75 ; 2.29,1.25 2.29,1.75 ; 2.29,2.25 2.29,1.75 ; 2.79,1.75 2.29,1.75 ; 4.33,1.75 4.83,1.75 ; 4.83,1.25 4.83,1.75 ; 4.83,2.25 4.83,1.75 ; 5.33,1.75 4.83,1.75 ; 6.87,1.75 7.37,1.75 ; 7.37,1.25 7.37,1.75 ; 7.37,2.25 7.37,1.75 ; 7.87,1.75 7.37,1.75
Mechanical 14:
  circle w0.1: c-7.8,-5 r0.5
  lines w0.1: -9.875,-5.775 9.875,-5.775 9.875,4.275 -9.875,4.275 -9.875,-5.775
3D body "DCDC_MURATA_NMJ.stp": height 12.75, standoff -3.75, extent -9.875,-5.775 9.875,4.275

## DCDC_MURATA_NMVXXXXS [mm] "NMV Series , Body 19.5 x 6mm, SIP-7"
height 10.25
pads (5):
  round 1.6 hole 0.9: 1(-7.87,1.75) 2(-5.33,1.75) 5(2.29,1.75) 6(4.83,1.75) 7(7.37,1.75)
Top Overlay:
  circle w0.3: c-7.8,-3.9 r0.15
  lines w0.2: -9.875,-3.125 9.875,-3.125 9.875,3.125 -9.875,3.125 -9.875,-3.125
Notvisible:
  lines w0.1: -8.37,1.75 -7.87,1.75 ; -7.87,1.25 -7.87,1.75 ; -7.87,2.25 -7.87,1.75 ; -7.37,1.75 -7.87,1.75 ; -5.83,1.75 -5.33,1.75 ; -5.33,1.25 -5.33,1.75 ; -5.33,2.25 -5.33,1.75 ; -4.83,1.75 -5.33,1.75 ; -0.5,0 0,0 ; 0,-0.5 0,0 ; 0,0.5 0,0 ; 0.5,0 0,0 ; 1.79,1.75 2.29,1.75 ; 2.29,1.25 2.29,1.75 ; 2.29,2.25 2.29,1.75 ; 2.79,1.75 2.29,1.75 ; 4.33,1.75 4.83,1.75 ; 4.83,1.25 4.83,1.75 ; 4.83,2.25 4.83,1.75 ; 5.33,1.75 4.83,1.75 ; 6.87,1.75 7.37,1.75 ; 7.37,1.25 7.37,1.75 ; 7.37,2.25 7.37,1.75 ; 7.87,1.75 7.37,1.75
Mechanical 14:
  circle w0.1: c-7.8,-2.54 r0.254
  lines w0.1: -9.875,-3.125 -9.875,3.125 9.875,3.125 9.875,-3.125 -9.875,-3.125
3D body "DCDC_MURATA_NMVXXXXS.stp": height 10.25, standoff -3.75, extent -9.875,-3.125 9.875,3.125

## DCDC_MURATA_NMXSO [mm] "NMXSO Series , Body 40.5x23.5mm, Height 10mm"
height 10.25
pads (5):
  round 2 hole 1.3: 1(-2.54,-10.16) 2(2.54,-10.16) 3(10.16,10.16) 4(0,10.16) 5(-10.16,10.16)
Top Overlay:
  lines w0.2: -20.375,-11.875 -20.375,11.875 20.375,11.875 20.375,-11.875 -20.375,-11.875
Notvisible:
  lines w0.1: -10.66,10.16 -10.16,10.16 ; -10.16,9.66 -10.16,10.16 ; -10.16,10.66 -10.16,10.16 ; -9.66,10.16 -10.16,10.16 ; -3.04,-10.16 -2.54,-10.16 ; -2.54,-10.66 -2.54,-10.16 ; -2.54,-9.66 -2.54,-10.16 ; -2.04,-10.16 -2.54,-10.16 ; -0.5,0 0,0 ; -0.5,10.16 0,10.16 ; 0,-0.5 0,0 ; 0,0.5 0,0 ; 0,9.66 0,10.16 ; 0,10.66 0,10.16 ; 0.5,0 0,0 ; 0.5,10.16 0,10.16 ; 2.04,-10.16 2.54,-10.16 ; 2.54,-10.66 2.54,-10.16 ; 2.54,-9.66 2.54,-10.16 ; 3.04,-10.16 2.54,-10.16 ; 9.66,10.16 10.16,10.16 ; 10.16,9.66 10.16,10.16 ; 10.16,10.66 10.16,10.16 ; 10.66,10.16 10.16,10.16
Mechanical 14:
  lines w0.1: -20.375,-11.875 -20.375,11.875 20.375,11.875 20.375,-11.875 -20.375,-11.875
3D body "DCDC_MURATA_NMXSO.stp": height 10.25, standoff -3.5, extent -20.375,-11.875 20.375,11.875

## DCDC_MURATA_TWR [mm] "TWR Series , Body 50.08 x 25.4mm, Height 9.53mm"
height 9.53
pads (6):
  round 2 hole 1.3: 1(-22.86,-2.54) 2(-22.86,2.54) 4(22.86,-10.16) 5(22.86,-5.08) 6(22.86,2.54) 7(22.86,10.16)
Top Overlay:
  lines w0.2: -25.4,-12.7 25.4,-12.7 25.4,12.7 -25.4,12.7 -25.4,-12.7
Notvisible:
  lines w0.1: -23.36,-2.54 -22.86,-2.54 ; -23.36,2.54 -22.86,2.54 ; -22.86,-3.04 -22.86,-2.54 ; -22.86,-2.04 -22.86,-2.54 ; -22.86,2.04 -22.86,2.54 ; -22.86,3.04 -22.86,2.54 ; -22.36,-2.54 -22.86,-2.54 ; -22.36,2.54 -22.86,2.54 ; -0.5,0 0,0 ; 0,-0.5 0,0 ; 0,0.5 0,0 ; 0.5,0 0,0 ; 22.36,-10.16 22.86,-10.16 ; 22.36,-5.08 22.86,-5.08 ; 22.36,2.54 22.86,2.54 ; 22.36,10.16 22.86,10.16 ; 22.86,-10.66 22.86,-10.16 ; 22.86,-9.66 22.86,-10.16 ; 22.86,-5.58 22.86,-5.08 ; 22.86,-4.58 22.86,-5.08 ; 22.86,2.04 22.86,2.54 ; 22.86,3.04 22.86,2.54 ; 22.86,9.66 22.86,10.16 ; 22.86,10.66 22.86,10.16 ; 23.36,-10.16 22.86,-10.16 ; 23.36,-5.08 22.86,-5.08 ; 23.36,2.54 22.86,2.54 ; 23.36,10.16 22.86,10.16
Mechanical 14:
  lines w0.1: -25.4,-12.7 25.4,-12.7 25.4,12.7 -25.4,12.7 -25.4,-12.7
3D body "DC-DC_MURATA_TWR.stp": height 9.53, standoff -3.8, extent -25.4,-12.7 25.4,12.7

## DCDC_SDS_APD_P [mm] "ADP Series , Body 25.5x20.5mm, high voltage DC-DC converter"
height 11
pads (7):
  round 1.7 hole 1.2: 1(-10.25,5.3) 2(-10.25,2.76) 3(-10.25,0.22) 4(-10.25,-2.32) 5(-10.25,-4.86) 6(-10.25,-7.4) 7(7.7,-4.78)
Top Overlay:
  lines w0.2: -12.75,-9.25 ccw(c-11.75,-9.25) -11.75,-10.25 11.75,-10.25 ccw(c11.75,-9.25) 12.75,-9.25 12.75,9.25 ccw(c11.75,9.25) 11.75,10.25 -11.75,10.25 ccw(c-11.75,9.25) -12.75,9.25 -12.75,-9.25
Mechanical 14:
  lines w0.1: -12.75,-9.25 ccw(c-11.75,-9.25) -11.75,-10.25 11.75,-10.25 ccw(c11.75,-9.25) 12.75,-9.25 12.75,9.25 ccw(c11.75,9.25) 11.75,10.25 -11.75,10.25 ccw(c-11.75,9.25) -12.75,9.25 -12.75,-9.25
Mechanical 15:
  lines w0.05: -13.5,-11 13.5,-11 13.5,11 -13.5,11 -13.5,-11
3D body "DCDC_SDS_APD_P.stp": height 11, standoff -3.6, extent -12.75,-10.25 12.75,10.25